# Altium footprint library heromap.PcbLib: 593 footprints (part 7 of 38)
Each footprint in its own frame and in the unit in brackets; x right, y up, seen from the top. Pads: shape width x height; smd on the part's side, far side on the other; paste and mask are expansions set on the pad; w line width, h text height; cw(c..) or ccw(c..) is an arc to the next point about the centre after c.
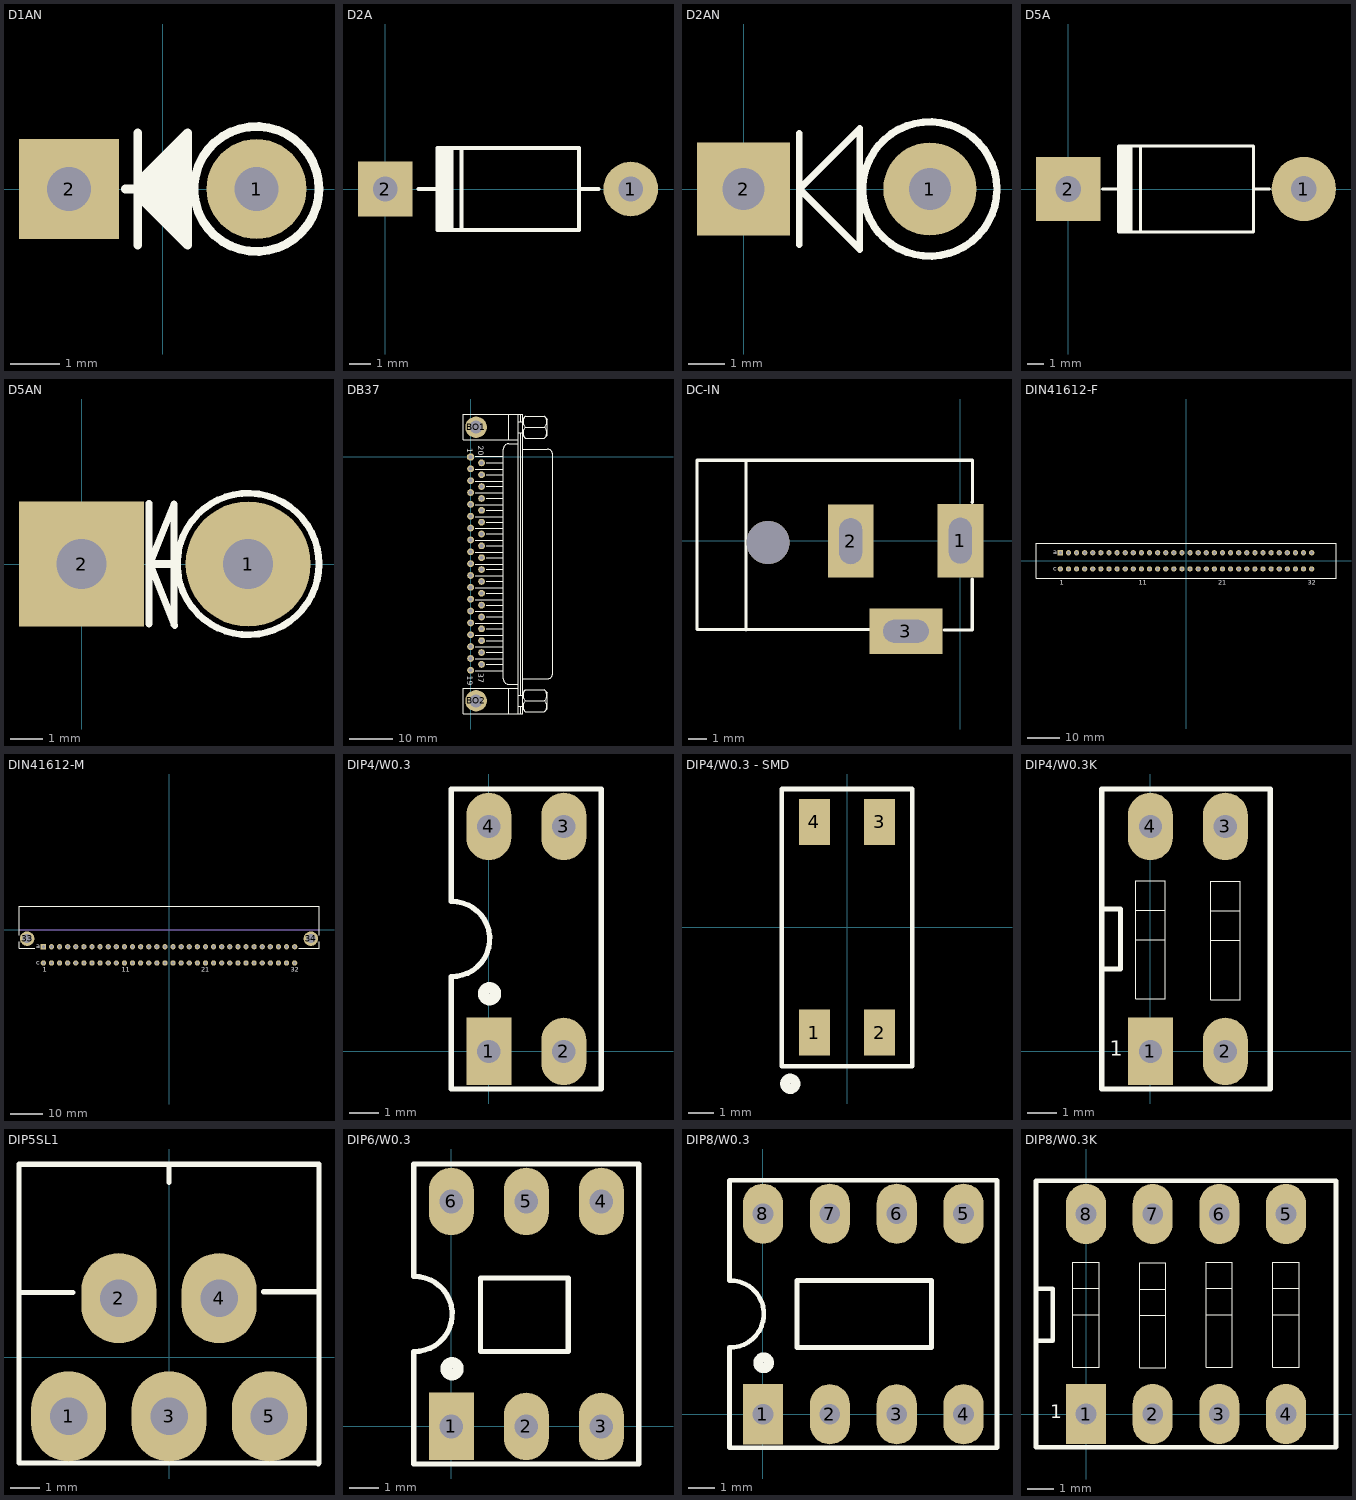
[diagram p6: the footprints below, top view; thin cyan lines are the x and y axes]

## D1AN [mil] "Diode 1A, W 100mil, L 150mil"
height 100
pads (2):
  round 80 hole 35: 1(75,0)
  rect 80x80 hole 35: 2(-75,0)
Top Overlay:
  circle w7: c75,0 r50
  region: 20,40 20,-40 15,-40 -20,-5 -20,5
  lines w7: -30,0 -20,0 ; -20,-45 -20,45 ; -20,-5 -20,5 20,45 20,-45 -20,-5
3D body "SW3dPS-1N4007_Stand.STEP": height 330.46, standoff 0, extent -64,-69 104,36

## D2A [mil] "Diode 2A, W 150mil, L 450mil"
height 100
pads (2):
  round 100 hole 45: 1(450,0)
  rect 100x100 hole 45: 2(0,0)
Top Overlay:
  rectangle: 95,-75 125,75
  lines w7: 61,0 96,0 ; 96,-31 96,0 ; 96,32 96,0 ; 140,-75 140,75 ; 355,0 391,0 ; 96,-75 355,-75 355,75 96,75 96,-75
3D body "SW3DPS-DIODE0_4-DEFAULT.STEP": height 100.5, standoff -100, extent 5,-47 435,54

## D2AN [mil] "Diode 2A, W 150mil, L 450mil"
height 100
pads (2):
  round 100 hole 45: 1(200,0)
  rect 100x100 hole 45: 2(0,0)
Top Overlay:
  circle w8: c200,0 r72.11
  lines w7: 60,-60 60,60 ; 125,50 125,65 60,0 125,-65 125,55
3D body "SW3dPS-Zener 1W_Stand.STEP": height 330.46, standoff 0, extent 46,-50 214,55

## D5A [mil] "Diode 5A, W 200mil, L 550mil"
height 150
pads (2):
  round 150 hole 60: 1(550,0)
  rect 150x150 hole 60: 2(0,0)
Top Overlay:
  rectangle: 120,-100 150,100
  lines w7: 80,0 118,0 ; 118,-44 118,0 ; 118,46 118,0 ; 169,-99 169,100 ; 432,0 470,0 ; 118,-100 432,-100 432,100 118,100 118,-100
3D body "SW3dPS-BYW98.STEP": height 254.33, standoff -86.22, extent -51.87,-106 589.87,102.66

## D5AN [mil] "Diode 5A, W 200mil, L 250mil"
height 150
pads (2):
  round 150 hole 60: 1(200,0)
  rect 150x150 hole 60: 2(0,0)
Top Overlay:
  circle w8: c200,0 r85
  lines w8: 81,-72 81,73 ; 82,0 111,72 111,-73 ; 83,-2 112,-74
  lines w10: 82,0 113,0
3D body "SW3dPS-Zener 1W_Stand.STEP": height 330.46, standoff 0, extent 21,-74 189,31

## DB37 [mil]
pads (39):
  oct 62x62 hole 35: 1(0,0)
  round 62 hole 35: 2(0,-108.33) 3(0,-216.67) 4(0,-325) 5(0,-433.33) 6(0,-541.67) 7(0,-650) 8(0,-758.33) 9(0,-866.67) 10(0,-975) 11(0,-1083.33) 12(0,-1191.67) 13(0,-1300) 14(0,-1408.33) 15(0,-1516.67) 16(0,-1625) 17(0,-1733.33) 18(0,-1841.67) 19(0,-1950) 20(100,-54.17) 21(100,-162.5) 22(100,-270.83) 23(100,-379.17) 24(100,-487.5) 25(100,-595.83) 26(100,-704.17) 27(100,-812.5) 28(100,-920.83) 29(100,-1029.17) 30(100,-1137.5) 31(100,-1245.83) 32(100,-1354.17) 33(100,-1462.5) 34(100,-1570.83) 35(100,-1679.17) 36(100,-1787.5) 37(100,-1895.83)
  round 196.67 hole 118.33: BO1(50,271.67) BO2(50,-2228.33)
Top Overlay:
  lines w8: 41.67,-1953.33 291.67,-1953.33 300,-1953.33 ; 41.67,-1845 291.67,-1845 300,-1845 ; 41.67,-1736.67 291.67,-1736.67 300,-1736.67 ; 41.67,-1628.33 291.67,-1628.33 300,-1628.33 ; 41.67,-1520 291.67,-1520 300,-1520 ; 41.67,-1411.67 291.67,-1411.67 300,-1411.67 ; 41.67,-1303.33 291.67,-1303.33 300,-1303.33 ; 41.67,-1195 291.67,-1195 300,-1195 ; 41.67,-1086.67 300,-1086.67 ; 41.67,-978.33 300,-978.33 ; 41.67,-870 291.67,-870 300,-870 ; 41.67,-761.67 291.67,-761.67 300,-761.67 ; 41.67,-653.33 291.67,-653.33 300,-653.33 ; 41.67,-545 291.67,-545 300,-545 ; 41.67,-436.67 291.67,-436.67 300,-436.67 ; 41.67,-328.33 291.67,-328.33 300,-328.33 ; 41.67,-220 291.67,-220 300,-220 ; 41.67,-111.67 291.67,-111.67 300,-111.67 ; 41.67,5 300,5 ; 141.67,-1895 300,-1895 ; 141.67,-1786.67 300,-1786.67 ; 141.67,-1678.33 300,-1678.33 ; 141.67,-1570 300,-1570 ; 141.67,-1461.67 300,-1461.67 ; 141.67,-1353.33 300,-1353.33 ; 141.67,-1245 300,-1245 ; 141.67,-1136.67 300,-1136.67 ; 141.67,-1028.33 300,-1028.33 ; 141.67,-920 300,-920 ; 141.67,-811.67 300,-811.67 ; 141.67,-703.33 300,-703.33 ; 141.67,-595 300,-595 ; 141.67,-486.67 300,-486.67 ; 141.67,-378.33 300,-378.33 ; 141.67,-270 300,-270 ; 141.67,-161.67 300,-161.67 ; 141.67,-53.33 300,-53.33 ; 350,-2345 350,-2111.67 ; 350,155 350,388.33 ; 433.33,-2345 433.33,388.33 ; 433.33,-2278.33 475,-2278.33 ; 433.33,-2178.33 475,-2178.33 ; 433.33,-2111.67 -66.67,-2111.67 -66.67,-2345 475,-2345 475,388.33 -66.67,388.33 -66.67,155 433.33,155 ; 433.33,-2078.33 350,-2078.33 cw(c350,-2028.33) 300,-2028.33 300,71.67 cw(c350,71.67) 350,121.67 433.33,121.67 ; 433.33,221.67 475,221.67 ; 433.33,321.67 475,321.67 ; 458.33,-2345 458.33,-2278.33 ; 458.33,-2178.33 458.33,221.67 ; 458.33,321.67 458.33,388.33 ; 475,-2303.33 500,-2328.33 675,-2328.33 700,-2303.33 700,-2153.33 675,-2128.33 500,-2128.33 475,-2153.33 ; 475,-2028.33 700,-2028.33 ccw(c700,-1978.33) 750,-1978.33 750,21.67 ccw(c700,21.67) 700,71.67 475,71.67 ; 475,196.67 500,171.67 675,171.67 700,196.67 700,346.67 675,371.67 500,371.67 475,346.67 ; 499.91,-2328.42 cw(c550,-2278.33) 499.91,-2228.25 ; 499.91,-2228.42 cw(c550,-2178.33) 499.91,-2128.25 ; 499.91,171.58 cw(c550,221.67) 499.91,271.75 ; 499.91,271.58 cw(c550,321.67) 499.91,371.75 ; 500,-2228.33 675,-2228.33 ; 500,271.67 675,271.67 ; 675.09,-2328.42 ccw(c625,-2278.33) 675.09,-2228.25 ; 675.09,-2228.42 ccw(c625,-2178.33) 675.09,-2128.25 ; 675.09,171.58 ccw(c625,221.67) 675.09,271.75 ; 675.09,271.58 ccw(c625,321.67) 675.09,371.75
  text "20" at 70,101.67 h50
  text "19" at -30,-1998.33 h50
  text "37" at 70,-1978.33 h50
  text "1" at -30,81.67 h50
3D body "connector_a-df_37_a_kg-t2.stp": height 483.86, standoff -180.51, extent -65.77,-2338.25 654.7,390.88

## DC-IN [mil] "Jac DC input"
height 200
pads (3):
  rect 100x160 hole 50 slot 100 at 90 deg: 1(0,0) 2(-240,-1)
  rect 160x100 hole 50 slot 100 at 0 deg: 3(-119,-198)
via -421,-4 diameter 94.49 hole 94.49
Top Overlay:
  lines w7: -576,-194 -576,176 26.18,176 ; -469,-195 -469,173
  lines w7.01: -576,-194 -197,-194 ; -36,-195 26.18,-195 26,-194.82 26,-84 ; 26,84 26.18,84.18 26.18,176
3D body "DC_jack_161-0721-EX.STEP": height 433.67, standoff -137.19, extent -576.18,-195 26.18,173.33

## DIN41612-F [mm] "Connector; DIN 41612, Type C, Thru-Hole; Rows a+c, 64 Position; Vertical; No Mounting Fixture"
height 13
pads (64):
  rect 1.65x1.65 hole 1: A1(-39.37,2.54)
  round 1.65 hole 1: A2(-36.83,2.54) A3(-34.29,2.54) A4(-31.75,2.54) A5(-29.21,2.54) A6(-26.67,2.54) A7(-24.13,2.54) A8(-21.59,2.54) A9(-19.05,2.54) A10(-16.51,2.54) A11(-13.97,2.54) A12(-11.43,2.54) A13(-8.89,2.54) A14(-6.35,2.54) A15(-3.81,2.54) A16(-1.27,2.54) A17(1.27,2.54) A18(3.81,2.54) A19(6.35,2.54) A20(8.89,2.54) A21(11.43,2.54) A22(13.97,2.54) A23(16.51,2.54) A24(19.05,2.54) A25(21.59,2.54) A26(24.13,2.54) A27(26.67,2.54) A28(29.21,2.54) A29(31.75,2.54) A30(34.29,2.54) A31(36.83,2.54) A32(39.37,2.54) C1(-39.37,-2.54) C2(-36.83,-2.54) C3(-34.29,-2.54) C4(-31.75,-2.54) C5(-29.21,-2.54) C6(-26.67,-2.54) C7(-24.13,-2.54) C8(-21.59,-2.54) C9(-19.05,-2.54) C10(-16.51,-2.54) C11(-13.97,-2.54) C12(-11.43,-2.54) C13(-8.89,-2.54) C14(-6.35,-2.54) C15(-3.81,-2.54) C16(-1.27,-2.54) C17(1.27,-2.54) C18(3.81,-2.54) C19(6.35,-2.54) C20(8.89,-2.54) C21(11.43,-2.54) C22(13.97,-2.54) C23(16.51,-2.54) C24(19.05,-2.54) C25(21.59,-2.54) C26(24.13,-2.54) C27(26.67,-2.54) C28(29.21,-2.54) C29(31.75,-2.54) C30(34.29,-2.54) C31(36.83,-2.54) C32(39.37,-2.54)
Top Overlay:
  lines w0.2: -47,-5.5 -47,5.5 47,5.5 47,-5.5 -47,-5.5
  text "21" at 10.18,-7.5 h1.5
  text "11" at -14.82,-7.5 h1.5
  text "32" at 38.12,-7.5 h1.5
  text "c" at -41.58,-3.04 h1.5
  text "a" at -41.58,2.04 h1.5
  text "1" at -39.62,-7.5 h1.5

## DIN41612-M [mm] "Connector; DIN 41612, Type C, Thru-Hole; Rows a+c, 64 Position; Right Angle"
height 11.1
pads (66):
  round 4.6 hole 2.8: 33(-44.45,-2.76) 34(44.45,-2.76)
  rect 1.65x1.65 hole 1: A1(-39.37,-5.3)
  round 1.65 hole 1: A2(-36.83,-5.3) A3(-34.29,-5.3) A4(-31.75,-5.3) A5(-29.21,-5.3) A6(-26.67,-5.3) A7(-24.13,-5.3) A8(-21.59,-5.3) A9(-19.05,-5.3) A10(-16.51,-5.3) A11(-13.97,-5.3) A12(-11.43,-5.3) A13(-8.89,-5.3) A14(-6.35,-5.3) A15(-3.81,-5.3) A16(-1.27,-5.3) A17(1.27,-5.3) A18(3.81,-5.3) A19(6.35,-5.3) A20(8.89,-5.3) A21(11.43,-5.3) A22(13.97,-5.3) A23(16.51,-5.3) A24(19.05,-5.3) A25(21.59,-5.3) A26(24.13,-5.3) A27(26.67,-5.3) A28(29.21,-5.3) A29(31.75,-5.3) A30(34.29,-5.3) A31(36.83,-5.3) A32(39.37,-5.3) C1(-39.37,-10.38) C2(-36.83,-10.38) C3(-34.29,-10.38) C4(-31.75,-10.38) C5(-29.21,-10.38) C6(-26.67,-10.38) C7(-24.13,-10.38) C8(-21.59,-10.38) C9(-19.05,-10.38) C10(-16.51,-10.38) C11(-13.97,-10.38) C12(-11.43,-10.38) C13(-8.89,-10.38) C14(-6.35,-10.38) C15(-3.81,-10.38) C16(-1.27,-10.38) C17(1.27,-10.38) C18(3.81,-10.38) C19(6.35,-10.38) C20(8.89,-10.38) C21(11.43,-10.38) C22(13.97,-10.38) C23(16.51,-10.38) C24(19.05,-10.38) C25(21.59,-10.38) C26(24.13,-10.38) C27(26.67,-10.38) C28(29.21,-10.38) C29(31.75,-10.38) C30(34.29,-10.38) C31(36.83,-10.38) C32(39.37,-10.38)
Top Overlay:
  lines w0.2: -47,-3.76 -47,-5.8 -42.07,-5.8 ; -47,-1.76 -47,7.34 47,7.34 47,-1.76 ; 40.595,-5.8 47,-5.8 47,-3.76
  text "1" at -39.62,-13.08 h1.5
  text "a" at -41.58,-5.8 h1.5
  text "c" at -41.58,-10.88 h1.5
  text "32" at 38.12,-13.08 h1.5
  text "11" at -14.845,-13.08 h1.5
  text "21" at 10.18,-13.08 h1.5
Mechanical 1:
  lines w0.1: -47,0 47,0
  text "PCB Edge" at -46.47,0.5 h0.6

## DIP4/W0.3 [mil] "4 PIN, W 300mil, Pin to pin 100mil"
height 100
pads (4):
  rect 60x90 hole 31: 1(0,0)
  oval 60x90 hole 31: 2(100,0) 3(100,300) 4(0,300)
Top Overlay:
  circle w15: c1,77 r8
  lines w7: -50.38,100.05 ccw(c-48.69,150.02) -50,200 ; -50,100 -50,-50 150,-50 150,350 -50,350 -50,201
3D body "SW3DPS-DIP4-DEFAULT.STEP": height 169.69, standoff -129.13, extent -59.06,-10 159.06,304.96

## DIP4/W0.3 - SMD [mm] "4 PIN, W 300mil, Pin to pin 100mil"
height 2.54
pads (4):
  rect 1.2x1.8 smd: 1(-1.27,-4.1) 2(1.27,-4.1) 3(1.27,4.1) 4(-1.27,4.1)
Top Overlay:
  circle w0.381: c-2.21,-6.096 r0.203
  lines w0.178: -2.54,-5.41 -2.54,-1.27 -2.54,5.385 2.54,5.385 2.54,-5.41 -2.54,-5.41
3D body: height 3.5, standoff 0.1, extent -2.311,-3.251 2.286,3.251
3D body: height 0.36, standoff 0.1, extent 0.813,3.759 1.727,4.75
3D body: height 1.8, standoff 0.1, extent 0.813,3.759 1.727,3.912
3D body: height 2.06, standoff 1.8, extent 0.813,3.2 1.727,3.912
3D body: height 2.06, standoff 1.8, extent -1.727,3.2 -0.813,3.912
3D body: height 1.8, standoff 0.1, extent -1.727,3.759 -0.813,3.912
3D body: height 0.36, standoff 0.1, extent -1.727,3.759 -0.813,4.75
3D body: height 2.06, standoff 1.8, extent 0.813,-3.912 1.727,-3.2
3D body: height 1.8, standoff 0.1, extent 0.813,-3.912 1.727,-3.759
3D body: height 0.36, standoff 0.1, extent 0.813,-4.75 1.727,-3.759
3D body: height 2.06, standoff 1.8, extent -1.727,-3.912 -0.813,-3.2
3D body: height 1.8, standoff 0.1, extent -1.727,-3.912 -0.813,-3.759
3D body: height 0.36, standoff 0.1, extent -1.727,-4.75 -0.813,-3.759

## DIP4/W0.3K [mil] "4 PIN, W 400mil , L 450mil,Pin to pin 100mil"
height 100
pads (4):
  rect 60x90 hole 31: 1(0,0)
  oval 60x90 hole 31: 2(100,0) 3(100,300) 4(0,300)
Top Overlay:
  lines w1.5: -19.68,149 19.68,149 ; -19.68,188.37 19.68,188.37 ; 80.31,148 119.69,148 ; 80.31,187.37 119.69,187.37 ; -19.68,70.26 19.68,70.26 19.68,227.74 -19.68,227.74 -19.68,70.26 ; 80.31,69.26 119.69,69.26 119.69,226.74 80.31,226.74 80.31,69.26
  lines w7: -65,110 -40,110 -40,190 -65,190 ; -65,-50 160,-50 160,350 -65,350 -65,-50
  text "1" at -54,-6 h20
3D body "User Library-Switch-Piano-DIP-2.STEP": height 354.33, standoff -157.48, extent -66.22,-103.43 170,343.43

## DIP5SL1 [mm]
pads (5):
  oval 2.54x3.048 hole 1.27: 1(-3.4,-2) 2(-1.7,2) 3(0,-2) 4(1.7,2) 5(3.4,-2)
Top Overlay:
  lines w0.178: -5.076,2.191 -3.248,2.191 ; 0,5.918 0,6.502 ; 3.204,2.216 5.033,2.216 ; -5.08,-3.581 -5.08,6.534 5.08,6.534 5.08,-3.581 5.055,-3.607 5.029,-3.581 -5.08,-3.581

## DIP6/W0.3 [mil] "6 PIN, W 300mil, Pin to pin 100mil"
height 100
pads (6):
  rect 60x90 hole 31.5: 1(0,0)
  oval 60x90 hole 31.5: 2(100,0) 3(200,0) 4(200,300) 5(100,300) 6(0,300)
Top Overlay:
  circle w15: c1,77 r8
  lines w7: -50.38,100.05 ccw(c-48.69,150.02) -50,200 ; -50,100 -50,-50 250,-50 250,350 -50,350 -50,201 ; 39,100 39,198 156,198 156,100 39,100
3D body "SW3DPS-DIP6-DEFAULT.STEP": height 169.69, standoff -129.13, extent -58.11,-7.48 260,307.48

## DIP8/W0.3 [mil] "8 PIN, W 300mil, Pin to pin 100mil"
height 100
pads (8):
  rect 60x90 hole 31: 1(0,0)
  oval 60x90 hole 31: 2(100,0) 3(200,0) 4(300,0) 5(300,300) 6(200,300) 7(100,300) 8(0,300)
Top Overlay:
  circle w15: c1,77 r8
  lines w7: -50.38,100.05 ccw(c-48.69,150.02) -50,200 ; -50,100 -50,-50 350,-50 350,350 -50,350 -50,201 ; 51,100 252,100 252,200 51,200 51,100
3D body "SW3dPS-DIP8-CER.STEP": height 201.25, standoff -129.47, extent -50,-40 350,336.4

## DIP8/W0.3K [mil] "8 PIN, W 400mil , L 450mil, Pin to pin 100mil For Switch"
height 100
pads (8):
  rect 60x90 hole 31: 1(0,0)
  oval 60x90 hole 31: 2(100,0) 3(200,0) 4(300,0) 5(300,300) 6(200,300) 7(100,300) 8(0,300)
Top Overlay:
  lines w1.5: -19.68,149 19.68,149 ; -19.68,188.37 19.68,188.37 ; 80.31,148 119.69,148 ; 80.31,187.37 119.69,187.37 ; 180.31,149 219.69,149 ; 180.31,188.37 219.69,188.37 ; 280.31,149 319.69,149 ; 280.31,188.37 319.69,188.37 ; -19.68,70.26 -19.68,227.74 19.68,227.74 19.68,70.26 -19.68,70.26 ; 80.31,69.26 80.31,226.74 119.69,226.74 119.69,69.26 80.31,69.26 ; 180.31,70.26 180.31,227.74 219.69,227.74 219.69,70.26 180.31,70.26 ; 280.31,70.26 280.31,227.74 319.69,227.74 319.69,70.26 280.31,70.26
  lines w7: -75,68.5 -75,233 ; -75,110 -50,110 -50,188 -74,188 -75,189 ; -75,126 -75,-50 375,-50 375,350 -75,350 -75,176
  text "1" at -54,-6 h20
3D body "switch 4bank x1.STEP": height 158.27, standoff -9.84, extent -80,-45.08 377.87,345.08